# Altium schematic symbol library jlcpcb_2025_04_capacitors_extended_0201.schlib: 1175 symbols (part 1 of 7) (continued)
## 0201CG180J500NT
designator C?  Capacitance: 18pF  (hidden comment: *)
Capacitor, Ceramic (MLCC), 18pF, ±5%, 50V, C0G, ±5%, SMD 0201; Manufacturer: FH (Guangdong Fenghua Advanced Tech); Manufacturer Part Number: 0201CG180J500NT; Package Size: 0201; JLCPCB Basic Part: No; JLCPCB Part Number: C62164; Supplier 1: LCSC; Category: Capacitors - MLCC; Supplier Part Number 1: C62164; Tolerance: ±5%; Voltage Rating: 50V; Temperature Coefficient: C0G; RoHS: Yes; ComponentLink1Description: Datasheet; ComponentLink1URL: https://wmsc.lcsc.com/wmsc/upload/file/pdf/v2/lcsc/2304140030_FH--Guangdong-Fenghua-Advanced-Tech-0201CG180J500NT_C62164.pdf; ComponentLink2Description: JLCPCB Part URL; ComponentLink2URL: https://jlcpcb.com/partdetail/C62164; ComponentLink3Description: LCSC Part URL; ComponentLink3URL: https://lcsc.com/product-detail/Multilayer-Ceramic-Capacitors-MLCC---SMD-SMT_FH-Guangdong-Fenghua-Advanced-Tech-FH-Guangdong-Fenghua-Advanced-Tech-0201CG180J500NT_C62164.html
footprint CAP-0201 (0201 (0603M) Capacitor)
pins: 1, 2

## 0201CG200J500NT
designator C?  Capacitance: 20pF  (hidden comment: *)
Capacitor, Ceramic (MLCC), 20pF, ±5%, 50V, C0G, ±5%, SMD 0201; Manufacturer: FH (Guangdong Fenghua Advanced Tech); Manufacturer Part Number: 0201CG200J500NT; Package Size: 0201; JLCPCB Basic Part: No; JLCPCB Part Number: C71879; Supplier 1: LCSC; Category: Capacitors - MLCC; Supplier Part Number 1: C71879; Tolerance: ±5%; Voltage Rating: 50V; Temperature Coefficient: C0G; RoHS: Yes; ComponentLink1Description: Datasheet; ComponentLink1URL: https://wmsc.lcsc.com/wmsc/upload/file/pdf/v2/lcsc/2304140030_FH--Guangdong-Fenghua-Advanced-Tech-0201CG200J500NT_C71879.pdf; ComponentLink2Description: JLCPCB Part URL; ComponentLink2URL: https://jlcpcb.com/partdetail/C71879; ComponentLink3Description: LCSC Part URL; ComponentLink3URL: https://lcsc.com/product-detail/Multilayer-Ceramic-Capacitors-MLCC---SMD-SMT_FH-Guangdong-Fenghua-Advanced-Tech-FH-Guangdong-Fenghua-Advanced-Tech-0201CG200J500NT_C71879.html
footprint CAP-0201 (0201 (0603M) Capacitor)
pins: 1, 2

## 0201CG220J250NT
designator C?  Capacitance: 22pF  (hidden comment: *)
Capacitor, Ceramic (MLCC), 22pF, ±5%, 25V, C0G, ±5%, SMD 0201; Manufacturer: FH (Guangdong Fenghua Advanced Tech); Manufacturer Part Number: 0201CG220J250NT; Package Size: 0201; JLCPCB Basic Part: No; JLCPCB Part Number: C285194; Supplier 1: LCSC; Category: Capacitors - MLCC; Supplier Part Number 1: C285194; Tolerance: ±5%; Voltage Rating: 25V; Temperature Coefficient: C0G; RoHS: Yes; ComponentLink1Description: Datasheet; ComponentLink2Description: JLCPCB Part URL; ComponentLink2URL: https://jlcpcb.com/partdetail/C285194; ComponentLink3Description: LCSC Part URL; ComponentLink3URL: https://lcsc.com/product-detail/Multilayer-Ceramic-Capacitors-MLCC---SMD-SMT_FH-Guangdong-Fenghua-Advanced-Tech-FH-Guangdong-Fenghua-Advanced-Tech-0201CG220J250NT_C285194.html
footprint CAP-0201 (0201 (0603M) Capacitor)
pins: 1, 2

## 0201CG220J500NT
designator C?  Capacitance: 22pF  (hidden comment: *)
Capacitor, Ceramic (MLCC), 22pF, ±5%, 50V, C0G, ±5%, SMD 0201; Manufacturer: FH (Guangdong Fenghua Advanced Tech); Manufacturer Part Number: 0201CG220J500NT; Package Size: 0201; JLCPCB Basic Part: No; JLCPCB Part Number: C57783; Supplier 1: LCSC; Category: Capacitors - MLCC; Supplier Part Number 1: C57783; Tolerance: ±5%; Voltage Rating: 50V; Temperature Coefficient: C0G; RoHS: Yes; ComponentLink1Description: Datasheet; ComponentLink1URL: https://wmsc.lcsc.com/wmsc/upload/file/pdf/v2/lcsc/2304140030_FH--Guangdong-Fenghua-Advanced-Tech-0201CG220J500NT_C57783.pdf; ComponentLink2Description: JLCPCB Part URL; ComponentLink2URL: https://jlcpcb.com/partdetail/C57783; ComponentLink3Description: LCSC Part URL; ComponentLink3URL: https://lcsc.com/product-detail/Multilayer-Ceramic-Capacitors-MLCC---SMD-SMT_FH-Guangdong-Fenghua-Advanced-Tech-FH-Guangdong-Fenghua-Advanced-Tech-0201CG220J500NT_C57783.html
footprint CAP-0201 (0201 (0603M) Capacitor)
pins: 1, 2

## 0201CG270J500NT
designator C?  Capacitance: 27pF  (hidden comment: *)
Capacitor, Ceramic (MLCC), 27pF, ±5%, 50V, C0G, ±5%, SMD 0201; Manufacturer: FH(Guangdong Fenghua Advanced Tech); Manufacturer Part Number: 0201CG270J500NT; Package Size: 0201; JLCPCB Basic Part: No; JLCPCB Part Number: C62541; Supplier 1: LCSC; Category: Capacitors - MLCC; Supplier Part Number 1: C62541; Tolerance: ±5%; Voltage Rating: 50V; Temperature Coefficient: C0G; RoHS: Yes; ComponentLink1Description: Datasheet; ComponentLink1URL: https://wmsc.lcsc.com/wmsc/upload/file/pdf/v2/lcsc/2304140030_FH--Guangdong-Fenghua-Advanced-Tech-0201CG270J500NT_C62541.pdf; ComponentLink2Description: JLCPCB Part URL; ComponentLink2URL: https://jlcpcb.com/partdetail/C62541; ComponentLink3Description: LCSC Part URL; ComponentLink3URL: https://lcsc.com/product-detail/Multilayer-Ceramic-Capacitors-MLCC---SMD-SMT_FH-Guangdong-Fenghua-Advanced-Tech-FH-Guangdong-Fenghua-Advanced-Tech-0201CG270J500NT_C62541.html
footprint CAP-0201 (0201 (0603M) Capacitor)
pins: 1, 2

## 0201CG300J250NT
designator C?  Capacitance: 30pF  (hidden comment: *)
Capacitor, Ceramic (MLCC), 30pF, ±5%, 25V, ±5%, SMD 0201; Manufacturer: FH (Guangdong Fenghua Advanced Tech); Manufacturer Part Number: 0201CG300J250NT; Package Size: 0201; JLCPCB Basic Part: No; JLCPCB Part Number: C2762281; Supplier 1: LCSC; Category: Capacitors - MLCC; Supplier Part Number 1: C2762281; Tolerance: ±5%; Voltage Rating: 25V; RoHS: Yes; ComponentLink1Description: Datasheet; ComponentLink1URL: https://wmsc.lcsc.com/wmsc/upload/file/pdf/v2/lcsc/2304140030_FH--Guangdong-Fenghua-Advanced-Tech-0201CG300J250NT_C2762281.pdf; ComponentLink2Description: JLCPCB Part URL; ComponentLink2URL: https://jlcpcb.com/partdetail/C2762281; ComponentLink3Description: LCSC Part URL; ComponentLink3URL: https://lcsc.com/product-detail/Multilayer-Ceramic-Capacitors-MLCC---SMD-SMT_FH-Guangdong-Fenghua-Advanced-Tech-FH-Guangdong-Fenghua-Advanced-Tech-0201CG300J250NT_C2762281.html
footprint CAP-0201 (0201 (0603M) Capacitor)
pins: 1, 2

## 0201CG330J250NT
designator C?  Capacitance: 33pF  (hidden comment: *)
Capacitor, Ceramic (MLCC), 33pF, ±5%, 25V, C0G, ±5%, SMD 0201; Manufacturer: FH(Guangdong Fenghua Advanced Tech); Manufacturer Part Number: 0201CG330J250NT; Package Size: 0201; JLCPCB Basic Part: No; JLCPCB Part Number: C285185; Supplier 1: LCSC; Category: Capacitors - MLCC; Supplier Part Number 1: C285185; Tolerance: ±5%; Voltage Rating: 25V; Temperature Coefficient: C0G; RoHS: Yes; ComponentLink1Description: Datasheet; ComponentLink1URL: https://wmsc.lcsc.com/wmsc/upload/file/pdf/v2/lcsc/2304140030_FH--Guangdong-Fenghua-Advanced-Tech-0201CG330J250NT_C285185.pdf; ComponentLink2Description: JLCPCB Part URL; ComponentLink2URL: https://jlcpcb.com/partdetail/C285185; ComponentLink3Description: LCSC Part URL; ComponentLink3URL: https://lcsc.com/product-detail/Multilayer-Ceramic-Capacitors-MLCC---SMD-SMT_FH-Guangdong-Fenghua-Advanced-Tech-FH-Guangdong-Fenghua-Advanced-Tech-0201CG330J250NT_C285185.html
footprint CAP-0201 (0201 (0603M) Capacitor)
pins: 1, 2

## 0201CG330J500NT
designator C?  Capacitance: 33pF  (hidden comment: *)
Capacitor, Ceramic (MLCC), 33pF, ±5%, 50V, C0G, ±5%, SMD 0201; Manufacturer: FH (Guangdong Fenghua Advanced Tech); Manufacturer Part Number: 0201CG330J500NT; Package Size: 0201; JLCPCB Basic Part: No; JLCPCB Part Number: C56903; Supplier 1: LCSC; Category: Capacitors - MLCC; Supplier Part Number 1: C56903; Tolerance: ±5%; Voltage Rating: 50V; Temperature Coefficient: C0G; RoHS: Yes; ComponentLink1Description: Datasheet; ComponentLink1URL: https://wmsc.lcsc.com/wmsc/upload/file/pdf/v2/lcsc/2304140030_FH--Guangdong-Fenghua-Advanced-Tech-0201CG330J500NT_C56903.pdf; ComponentLink2Description: JLCPCB Part URL; ComponentLink2URL: https://jlcpcb.com/partdetail/C56903; ComponentLink3Description: LCSC Part URL; ComponentLink3URL: https://lcsc.com/product-detail/Multilayer-Ceramic-Capacitors-MLCC---SMD-SMT_FH-Guangdong-Fenghua-Advanced-Tech-FH-Guangdong-Fenghua-Advanced-Tech-0201CG330J500NT_C56903.html
footprint CAP-0201 (0201 (0603M) Capacitor)
pins: 1, 2

## 0201CG390J500NT
designator C?  Capacitance: 39pF  (hidden comment: *)
Capacitor, Ceramic (MLCC), 39pF, ±5%, 50V, C0G, ±5%, SMD 0201; Manufacturer: FH (Guangdong Fenghua Advanced Tech); Manufacturer Part Number: 0201CG390J500NT; Package Size: 0201; JLCPCB Basic Part: No; JLCPCB Part Number: C285092; Supplier 1: LCSC; Category: Capacitors - MLCC; Supplier Part Number 1: C285092; Tolerance: ±5%; Voltage Rating: 50V; Temperature Coefficient: C0G; RoHS: Yes; ComponentLink1Description: Datasheet; ComponentLink1URL: https://wmsc.lcsc.com/wmsc/upload/file/pdf/v2/lcsc/2304140030_FH--Guangdong-Fenghua-Advanced-Tech-0201CG390J500NT_C285092.pdf; ComponentLink2Description: JLCPCB Part URL; ComponentLink2URL: https://jlcpcb.com/partdetail/C285092; ComponentLink3Description: LCSC Part URL; ComponentLink3URL: https://lcsc.com/product-detail/Multilayer-Ceramic-Capacitors-MLCC---SMD-SMT_FH-Guangdong-Fenghua-Advanced-Tech-FH-Guangdong-Fenghua-Advanced-Tech-0201CG390J500NT_C285092.html
footprint CAP-0201 (0201 (0603M) Capacitor)
pins: 1, 2

## 0201CG470J500NT
designator C?  Capacitance: 47pF  (hidden comment: *)
Capacitor, Ceramic (MLCC), 47pF, ±5%, 50V, C0G, ±5%, SMD 0201; Manufacturer: FH (Guangdong Fenghua Advanced Tech); Manufacturer Part Number: 0201CG470J500NT; Package Size: 0201; JLCPCB Basic Part: No; JLCPCB Part Number: C62546; Supplier 1: LCSC; Category: Capacitors - MLCC; Supplier Part Number 1: C62546; Tolerance: ±5%; Voltage Rating: 50V; Temperature Coefficient: C0G; RoHS: Yes; ComponentLink1Description: Datasheet; ComponentLink1URL: https://wmsc.lcsc.com/wmsc/upload/file/pdf/v2/lcsc/2304140030_FH--Guangdong-Fenghua-Advanced-Tech-0201CG470J500NT_C62546.pdf; ComponentLink2Description: JLCPCB Part URL; ComponentLink2URL: https://jlcpcb.com/partdetail/C62546; ComponentLink3Description: LCSC Part URL; ComponentLink3URL: https://lcsc.com/product-detail/Multilayer-Ceramic-Capacitors-MLCC---SMD-SMT_FH-Guangdong-Fenghua-Advanced-Tech-FH-Guangdong-Fenghua-Advanced-Tech-0201CG470J500NT_C62546.html
footprint CAP-0201 (0201 (0603M) Capacitor)
pins: 1, 2

## 0201CG680J500NT
designator C?  Capacitance: 68pF  (hidden comment: *)
Capacitor, Ceramic (MLCC), 68pF, ±5%, 50V, C0G, ±5%, SMD 0201; Manufacturer: FH (Guangdong Fenghua Advanced Tech); Manufacturer Part Number: 0201CG680J500NT; Package Size: 0201; JLCPCB Basic Part: No; JLCPCB Part Number: C192309; Supplier 1: LCSC; Category: Capacitors - MLCC; Supplier Part Number 1: C192309; Tolerance: ±5%; Voltage Rating: 50V; Temperature Coefficient: C0G; RoHS: Yes; ComponentLink1Description: Datasheet; ComponentLink1URL: https://wmsc.lcsc.com/wmsc/upload/file/pdf/v2/lcsc/1811061040_FH--Guangdong-Fenghua-Advanced-Tech-0201CG680J500NT_C192309.pdf; ComponentLink2Description: JLCPCB Part URL; ComponentLink2URL: https://jlcpcb.com/partdetail/C192309; ComponentLink3Description: LCSC Part URL; ComponentLink3URL: https://lcsc.com/product-detail/Multilayer-Ceramic-Capacitors-MLCC---SMD-SMT_FH-Guangdong-Fenghua-Advanced-Tech-FH-Guangdong-Fenghua-Advanced-Tech-0201CG680J500NT_C192309.html
footprint CAP-0201 (0201 (0603M) Capacitor)
pins: 1, 2

## 0201CGR75B500NT
designator C?  Capacitance: 0.75pF  (hidden comment: *)
Capacitor, Ceramic (MLCC), 0.75pF, 50V, C0G, SMD 0201; Manufacturer: FH (Guangdong Fenghua Advanced Tech); Manufacturer Part Number: 0201CGR75B500NT; Package Size: 0201; JLCPCB Basic Part: No; JLCPCB Part Number: C284994; Supplier 1: LCSC; Category: Capacitors - MLCC; Supplier Part Number 1: C284994; Voltage Rating: 50V; Temperature Coefficient: C0G; RoHS: Yes; ComponentLink1Description: Datasheet; ComponentLink1URL: https://wmsc.lcsc.com/wmsc/upload/file/pdf/v2/lcsc/2204121100_FH--Guangdong-Fenghua-Advanced-Tech-0201CGR75B500NT_C284994.pdf; ComponentLink2Description: JLCPCB Part URL; ComponentLink2URL: https://jlcpcb.com/partdetail/C284994; ComponentLink3Description: LCSC Part URL; ComponentLink3URL: https://lcsc.com/product-detail/Multilayer-Ceramic-Capacitors-MLCC---SMD-SMT_FH-Guangdong-Fenghua-Advanced-Tech-FH-Guangdong-Fenghua-Advanced-Tech-0201CGR75B500NT_C284994.html
footprint CAP-0201 (0201 (0603M) Capacitor)
pins: 1, 2

## 0201HQ1R2B250NT
designator C?  Capacitance: 1.2pF  (hidden comment: *)
Capacitor, Ceramic (MLCC), 1.2pF, 25V, C0G, SMD 0201; Manufacturer: FH(Guangdong Fenghua Advanced Tech); Manufacturer Part Number: 0201HQ1R2B250NT; Package Size: 0201; JLCPCB Basic Part: No; JLCPCB Part Number: C284970; Supplier 1: LCSC; Category: Capacitors - MLCC; Supplier Part Number 1: C284970; Voltage Rating: 25V; Temperature Coefficient: C0G; RoHS: Yes; ComponentLink1Description: Datasheet; ComponentLink1URL: https://wmsc.lcsc.com/wmsc/upload/file/pdf/v2/lcsc/2304140030_FH--Guangdong-Fenghua-Advanced-Tech-0201HQ1R2B250NT_C284970.pdf; ComponentLink2Description: JLCPCB Part URL; ComponentLink2URL: https://jlcpcb.com/partdetail/C284970; ComponentLink3Description: LCSC Part URL; ComponentLink3URL: https://lcsc.com/product-detail/Multilayer-Ceramic-Capacitors-MLCC---SMD-SMT_FH-Guangdong-Fenghua-Advanced-Tech-FH-Guangdong-Fenghua-Advanced-Tech-0201HQ1R2B250NT_C284970.html
footprint CAP-0201 (0201 (0603M) Capacitor)
pins: 1, 2

## 0201HQ1R5B250NT
designator C?  Capacitance: 1.5pF  (hidden comment: *)
Capacitor, Ceramic (MLCC), 1.5pF, 25V, C0G, SMD 0201; Manufacturer: FH(Guangdong Fenghua Advanced Tech); Manufacturer Part Number: 0201HQ1R5B250NT; Package Size: 0201; JLCPCB Basic Part: No; JLCPCB Part Number: C284980; Supplier 1: LCSC; Category: Capacitors - MLCC; Supplier Part Number 1: C284980; Voltage Rating: 25V; Temperature Coefficient: C0G; RoHS: Yes; ComponentLink1Description: Datasheet; ComponentLink1URL: https://wmsc.lcsc.com/wmsc/upload/file/pdf/v2/lcsc/2304140030_FH--Guangdong-Fenghua-Advanced-Tech-0201HQ1R5B250NT_C284980.pdf; ComponentLink2Description: JLCPCB Part URL; ComponentLink2URL: https://jlcpcb.com/partdetail/C284980; ComponentLink3Description: LCSC Part URL; ComponentLink3URL: https://lcsc.com/product-detail/Multilayer-Ceramic-Capacitors-MLCC---SMD-SMT_FH-Guangdong-Fenghua-Advanced-Tech-FH-Guangdong-Fenghua-Advanced-Tech-0201HQ1R5B250NT_C284980.html
footprint CAP-0201 (0201 (0603M) Capacitor)
pins: 1, 2

## 0201HQ2R7B250NT
designator C?  Capacitance: 2.7pF  (hidden comment: *)
Capacitor, Ceramic (MLCC), 2.7pF, 25V, C0G, SMD 0201; Manufacturer: FH(Guangdong Fenghua Advanced Tech); Manufacturer Part Number: 0201HQ2R7B250NT; Package Size: 0201; JLCPCB Basic Part: No; JLCPCB Part Number: C284998; Supplier 1: LCSC; Category: Capacitors - MLCC; Supplier Part Number 1: C284998; Voltage Rating: 25V; Temperature Coefficient: C0G; RoHS: Yes; ComponentLink1Description: Datasheet; ComponentLink1URL: https://wmsc.lcsc.com/wmsc/upload/file/pdf/v2/lcsc/2304140030_FH--Guangdong-Fenghua-Advanced-Tech-0201HQ2R7B250NT_C284998.pdf; ComponentLink2Description: JLCPCB Part URL; ComponentLink2URL: https://jlcpcb.com/partdetail/C284998; ComponentLink3Description: LCSC Part URL; ComponentLink3URL: https://lcsc.com/product-detail/Multilayer-Ceramic-Capacitors-MLCC---SMD-SMT_FH-Guangdong-Fenghua-Advanced-Tech-FH-Guangdong-Fenghua-Advanced-Tech-0201HQ2R7B250NT_C284998.html
footprint CAP-0201 (0201 (0603M) Capacitor)
pins: 1, 2

## 0201N0R2B250CT
designator C?  Capacitance: 0.2pF  (hidden comment: *)
Capacitor, Ceramic (MLCC), 0.2pF, 25V, NP0, SMD 0201; Manufacturer: Walsin Tech Corp; Manufacturer Part Number: 0201N0R2B250CT; Package Size: 0201; JLCPCB Basic Part: No; JLCPCB Part Number: C880830; Supplier 1: LCSC; Category: Capacitors - MLCC; Supplier Part Number 1: C880830; Voltage Rating: 25V; Temperature Coefficient: NP0; RoHS: Yes; ComponentLink1Description: Datasheet; ComponentLink1URL: https://wmsc.lcsc.com/wmsc/upload/file/pdf/v2/lcsc/2304140030_Walsin-Tech-Corp-0201N0R2B250CT_C880830.pdf; ComponentLink2Description: JLCPCB Part URL; ComponentLink2URL: https://jlcpcb.com/partdetail/C880830; ComponentLink3Description: LCSC Part URL; ComponentLink3URL: https://lcsc.com/product-detail/Multilayer-Ceramic-Capacitors-MLCC---SMD-SMT_Walsin-Tech-Corp-Walsin-Tech-Corp-0201N0R2B250CT_C880830.html
footprint CAP-0201 (0201 (0603M) Capacitor)
pins: 1, 2

## 0201N0R5C250CT
designator C?  Capacitance: 0.5pF  (hidden comment: *)
Capacitor, Ceramic (MLCC), 0.5pF, 25V, NP0, SMD 0201; Manufacturer: Walsin Tech Corp; Manufacturer Part Number: 0201N0R5C250CT; Package Size: 0201; JLCPCB Basic Part: No; JLCPCB Part Number: C525487; Supplier 1: LCSC; Category: Capacitors - MLCC; Supplier Part Number 1: C525487; Voltage Rating: 25V; Temperature Coefficient: NP0; RoHS: Yes; ComponentLink1Description: Datasheet; ComponentLink1URL: https://wmsc.lcsc.com/wmsc/upload/file/pdf/v2/lcsc/2304140030_Walsin-Tech-Corp-0201N0R5C250CT_C525487.pdf; ComponentLink2Description: JLCPCB Part URL; ComponentLink2URL: https://jlcpcb.com/partdetail/C525487; ComponentLink3Description: LCSC Part URL; ComponentLink3URL: https://lcsc.com/product-detail/Multilayer-Ceramic-Capacitors-MLCC---SMD-SMT_Walsin-Tech-Corp-Walsin-Tech-Corp-0201N0R5C250CT_C525487.html
footprint CAP-0201 (0201 (0603M) Capacitor)
pins: 1, 2

## 0201N0R8C500CT
designator C?  Capacitance: 0.8pF  (hidden comment: *)
Capacitor, Ceramic (MLCC), 0.8pF, 50V, NP0, SMD 0201; Manufacturer: Walsin Tech Corp; Manufacturer Part Number: 0201N0R8C500CT; Package Size: 0201; JLCPCB Basic Part: No; JLCPCB Part Number: C880883; Supplier 1: LCSC; Category: Capacitors - MLCC; Supplier Part Number 1: C880883; Voltage Rating: 50V; Temperature Coefficient: NP0; RoHS: Yes; ComponentLink1Description: Datasheet; ComponentLink1URL: https://wmsc.lcsc.com/wmsc/upload/file/pdf/v2/lcsc/2304140030_Walsin-Tech-Corp-0201N0R8C500CT_C880883.pdf; ComponentLink2Description: JLCPCB Part URL; ComponentLink2URL: https://jlcpcb.com/partdetail/C880883; ComponentLink3Description: LCSC Part URL; ComponentLink3URL: https://lcsc.com/product-detail/Multilayer-Ceramic-Capacitors-MLCC---SMD-SMT_Walsin-Tech-Corp-Walsin-Tech-Corp-0201N0R8C500CT_C880883.html
footprint CAP-0201 (0201 (0603M) Capacitor)
pins: 1, 2

## 0201N1R0C500LT
designator C?  Capacitance: 1pF  (hidden comment: *)
Capacitor, Ceramic (MLCC), 1pF, 50V, NP0, SMD 0201; Manufacturer: Walsin Tech Corp; Manufacturer Part Number: 0201N1R0C500LT; Package Size: 0201; JLCPCB Basic Part: No; JLCPCB Part Number: C364218; Supplier 1: LCSC; Category: Capacitors - MLCC; Supplier Part Number 1: C364218; Voltage Rating: 50V; Temperature Coefficient: NP0; RoHS: Yes; ComponentLink1Description: Datasheet; ComponentLink1URL: https://wmsc.lcsc.com/wmsc/upload/file/pdf/v2/lcsc/2304140030_Walsin-Tech-Corp-0201N1R0C500LT_C364218.pdf; ComponentLink2Description: JLCPCB Part URL; ComponentLink2URL: https://jlcpcb.com/partdetail/C364218; ComponentLink3Description: LCSC Part URL; ComponentLink3URL: https://lcsc.com/product-detail/Multilayer-Ceramic-Capacitors-MLCC---SMD-SMT_Walsin-Tech-Corp-Walsin-Tech-Corp-0201N1R0C500LT_C364218.html
footprint CAP-0201 (0201 (0603M) Capacitor)
pins: 1, 2

## 0201N1R2A500CT
designator C?  Capacitance: 1.2pF  (hidden comment: *)
Capacitor, Ceramic (MLCC), 1.2pF, 50V, NP0, SMD 0201; Manufacturer: Walsin Tech Corp; Manufacturer Part Number: 0201N1R2A500CT; Package Size: 0201; JLCPCB Basic Part: No; JLCPCB Part Number: C880792; Supplier 1: LCSC; Category: Capacitors - MLCC; Supplier Part Number 1: C880792; Voltage Rating: 50V; Temperature Coefficient: NP0; RoHS: Yes; ComponentLink1Description: Datasheet; ComponentLink1URL: https://wmsc.lcsc.com/wmsc/upload/file/pdf/v2/lcsc/2304140030_Walsin-Tech-Corp-0201N1R2A500CT_C880792.pdf; ComponentLink2Description: JLCPCB Part URL; ComponentLink2URL: https://jlcpcb.com/partdetail/C880792; ComponentLink3Description: LCSC Part URL; ComponentLink3URL: https://lcsc.com/product-detail/Multilayer-Ceramic-Capacitors-MLCC---SMD-SMT_Walsin-Tech-Corp-Walsin-Tech-Corp-0201N1R2A500CT_C880792.html
footprint CAP-0201 (0201 (0603M) Capacitor)
pins: 1, 2

## 0201N1R2B500CT
designator C?  Capacitance: 1.2pF  (hidden comment: *)
Capacitor, Ceramic (MLCC), 1.2pF, 50V, NP0, SMD 0201; Manufacturer: Walsin Tech Corp; Manufacturer Part Number: 0201N1R2B500CT; Package Size: 0201; JLCPCB Basic Part: No; JLCPCB Part Number: C880803; Supplier 1: LCSC; Category: Capacitors - MLCC; Supplier Part Number 1: C880803; Voltage Rating: 50V; Temperature Coefficient: NP0; RoHS: Yes; ComponentLink1Description: Datasheet; ComponentLink1URL: https://wmsc.lcsc.com/wmsc/upload/file/pdf/v2/lcsc/2304140030_Walsin-Tech-Corp-0201N1R2B500CT_C880803.pdf; ComponentLink2Description: JLCPCB Part URL; ComponentLink2URL: https://jlcpcb.com/partdetail/C880803; ComponentLink3Description: LCSC Part URL; ComponentLink3URL: https://lcsc.com/product-detail/Multilayer-Ceramic-Capacitors-MLCC---SMD-SMT_Walsin-Tech-Corp-Walsin-Tech-Corp-0201N1R2B500CT_C880803.html
footprint CAP-0201 (0201 (0603M) Capacitor)
pins: 1, 2

## 0201N1R5C250CT
designator C?  Capacitance: 1.5pF  (hidden comment: *)
Capacitor, Ceramic (MLCC), 1.5pF, 25V, NP0, SMD 0201; Manufacturer: Walsin Tech Corp; Manufacturer Part Number: 0201N1R5C250CT; Package Size: 0201; JLCPCB Basic Part: No; JLCPCB Part Number: C424820; Supplier 1: LCSC; Category: Capacitors - MLCC; Supplier Part Number 1: C424820; Voltage Rating: 25V; Temperature Coefficient: NP0; RoHS: Yes; ComponentLink1Description: Datasheet; ComponentLink1URL: https://wmsc.lcsc.com/wmsc/upload/file/pdf/v2/lcsc/2304140030_Walsin-Tech-Corp-0201N1R5C250CT_C424820.pdf; ComponentLink2Description: JLCPCB Part URL; ComponentLink2URL: https://jlcpcb.com/partdetail/C424820; ComponentLink3Description: LCSC Part URL; ComponentLink3URL: https://lcsc.com/product-detail/Multilayer-Ceramic-Capacitors-MLCC---SMD-SMT_Walsin-Tech-Corp-Walsin-Tech-Corp-0201N1R5C250CT_C424820.html
footprint CAP-0201 (0201 (0603M) Capacitor)
pins: 1, 2

## 0201N1R6C500CT
designator C?  Capacitance: 1.6pF  (hidden comment: *)
Capacitor, Ceramic (MLCC), 1.6pF, 50V, NP0, SMD 0201; Manufacturer: Walsin Tech Corp; Manufacturer Part Number: 0201N1R6C500CT; Package Size: 0201; JLCPCB Basic Part: No; JLCPCB Part Number: C555390; Supplier 1: LCSC; Category: Capacitors - MLCC; Supplier Part Number 1: C555390; Voltage Rating: 50V; Temperature Coefficient: NP0; RoHS: Yes; ComponentLink1Description: Datasheet; ComponentLink1URL: https://wmsc.lcsc.com/wmsc/upload/file/pdf/v2/lcsc/2304140030_Walsin-Tech-Corp-0201N1R6C500CT_C555390.pdf; ComponentLink2Description: JLCPCB Part URL; ComponentLink2URL: https://jlcpcb.com/partdetail/C555390; ComponentLink3Description: LCSC Part URL; ComponentLink3URL: https://lcsc.com/product-detail/Multilayer-Ceramic-Capacitors-MLCC---SMD-SMT_Walsin-Tech-Corp-Walsin-Tech-Corp-0201N1R6C500CT_C555390.html
footprint CAP-0201 (0201 (0603M) Capacitor)
pins: 1, 2

## 0201N2R0C500CT
designator C?  Capacitance: 2pF  (hidden comment: *)
Capacitor, Ceramic (MLCC), 2pF, 50V, NP0, SMD 0201; Manufacturer: Walsin Tech Corp; Manufacturer Part Number: 0201N2R0C500CT; Package Size: 0201; JLCPCB Basic Part: No; JLCPCB Part Number: C295910; Supplier 1: LCSC; Category: Capacitors - MLCC; Supplier Part Number 1: C295910; Voltage Rating: 50V; Temperature Coefficient: NP0; RoHS: Yes; ComponentLink1Description: Datasheet; ComponentLink1URL: https://wmsc.lcsc.com/wmsc/upload/file/pdf/v2/lcsc/2304140030_Walsin-Tech-Corp-0201N2R0C500CT_C295910.pdf; ComponentLink2Description: JLCPCB Part URL; ComponentLink2URL: https://jlcpcb.com/partdetail/C295910; ComponentLink3Description: LCSC Part URL; ComponentLink3URL: https://lcsc.com/product-detail/Multilayer-Ceramic-Capacitors-MLCC---SMD-SMT_Walsin-Tech-Corp-Walsin-Tech-Corp-0201N2R0C500CT_C295910.html
footprint CAP-0201 (0201 (0603M) Capacitor)
pins: 1, 2

## 0201N2R2B250CT
designator C?  Capacitance: 2.2pF  (hidden comment: *)
Capacitor, Ceramic (MLCC), 2.2pF, 25V, NP0, SMD 0201; Manufacturer: Walsin Tech Corp; Manufacturer Part Number: 0201N2R2B250CT; Package Size: 0201; JLCPCB Basic Part: No; JLCPCB Part Number: C2840189; Supplier 1: LCSC; Category: Capacitors - MLCC; Supplier Part Number 1: C2840189; Voltage Rating: 25V; Temperature Coefficient: NP0; RoHS: Yes; ComponentLink1Description: Datasheet; ComponentLink1URL: https://wmsc.lcsc.com/wmsc/upload/file/pdf/v2/lcsc/2202132000_Walsin-Tech-Corp-0201N2R2B250CT_C2840189.pdf; ComponentLink2Description: JLCPCB Part URL; ComponentLink2URL: https://jlcpcb.com/partdetail/C2840189; ComponentLink3Description: LCSC Part URL; ComponentLink3URL: https://lcsc.com/product-detail/Multilayer-Ceramic-Capacitors-MLCC---SMD-SMT_Walsin-Tech-Corp-Walsin-Tech-Corp-0201N2R2B250CT_C2840189.html
footprint CAP-0201 (0201 (0603M) Capacitor)
pins: 1, 2

## 0201N2R2B500CT
designator C?  Capacitance: 2.2pF  (hidden comment: *)
Capacitor, Ceramic (MLCC), 2.2pF, 50V, NP0, SMD 0201; Manufacturer: Walsin Tech Corp; Manufacturer Part Number: 0201N2R2B500CT; Package Size: 0201; JLCPCB Basic Part: No; JLCPCB Part Number: C880846; Supplier 1: LCSC; Category: Capacitors - MLCC; Supplier Part Number 1: C880846; Voltage Rating: 50V; Temperature Coefficient: NP0; RoHS: Yes; ComponentLink1Description: Datasheet; ComponentLink1URL: https://wmsc.lcsc.com/wmsc/upload/file/pdf/v2/lcsc/2304140030_Walsin-Tech-Corp-0201N2R2B500CT_C880846.pdf; ComponentLink2Description: JLCPCB Part URL; ComponentLink2URL: https://jlcpcb.com/partdetail/C880846; ComponentLink3Description: LCSC Part URL; ComponentLink3URL: https://lcsc.com/product-detail/Multilayer-Ceramic-Capacitors-MLCC---SMD-SMT_Walsin-Tech-Corp-Walsin-Tech-Corp-0201N2R2B500CT_C880846.html
footprint CAP-0201 (0201 (0603M) Capacitor)
pins: 1, 2

## 0201N2R2C500
designator C?  Capacitance: 2.2pF  (hidden comment: *)
Capacitor, Ceramic (MLCC), 2.2pF, 50V, NP0, SMD 0201; Manufacturer: Walsin Tech Corp; Manufacturer Part Number: 0201N2R2C500; Package Size: 0201; JLCPCB Basic Part: No; JLCPCB Part Number: C152770; Supplier 1: LCSC; Category: Capacitors - MLCC; Supplier Part Number 1: C152770; Voltage Rating: 50V; Temperature Coefficient: NP0; RoHS: Yes; ComponentLink1Description: Datasheet; ComponentLink1URL: https://wmsc.lcsc.com/wmsc/upload/file/pdf/v2/lcsc/2304140030_Walsin-Tech-Corp-0201N2R2C500_C152770.pdf; ComponentLink2Description: JLCPCB Part URL; ComponentLink2URL: https://jlcpcb.com/partdetail/C152770; ComponentLink3Description: LCSC Part URL; ComponentLink3URL: https://lcsc.com/product-detail/Multilayer-Ceramic-Capacitors-MLCC---SMD-SMT_Walsin-Tech-Corp-Walsin-Tech-Corp-0201N2R2C500_C152770.html
footprint CAP-0201 (0201 (0603M) Capacitor)
pins: 1, 2

## 0201N3R0C250CT
designator C?  Capacitance: 3pF  (hidden comment: *)
Capacitor, Ceramic (MLCC), 3pF, 25V, NP0, SMD 0201; Manufacturer: Walsin Tech Corp; Manufacturer Part Number: 0201N3R0C250CT; Package Size: 0201; JLCPCB Basic Part: No; JLCPCB Part Number: C2918053; Supplier 1: LCSC; Category: Capacitors - MLCC; Supplier Part Number 1: C2918053; Voltage Rating: 25V; Temperature Coefficient: NP0; RoHS: Yes; ComponentLink1Description: Datasheet; ComponentLink1URL: https://wmsc.lcsc.com/wmsc/upload/file/pdf/v2/lcsc/2111181830_Walsin-Tech-Corp-0201N3R0C250CT_C2918053.pdf; ComponentLink2Description: JLCPCB Part URL; ComponentLink2URL: https://jlcpcb.com/partdetail/C2918053; ComponentLink3Description: LCSC Part URL; ComponentLink3URL: https://lcsc.com/product-detail/Multilayer-Ceramic-Capacitors-MLCC---SMD-SMT_Walsin-Tech-Corp-Walsin-Tech-Corp-0201N3R0C250CT_C2918053.html
footprint CAP-0201 (0201 (0603M) Capacitor)
pins: 1, 2

## 0201N3R0C500CT
designator C?  Capacitance: 3pF  (hidden comment: *)
Capacitor, Ceramic (MLCC), 3pF, 50V, NP0, SMD 0201; Manufacturer: Walsin Tech Corp; Manufacturer Part Number: 0201N3R0C500CT; Package Size: 0201; JLCPCB Basic Part: No; JLCPCB Part Number: C295912; Supplier 1: LCSC; Category: Capacitors - MLCC; Supplier Part Number 1: C295912; Voltage Rating: 50V; Temperature Coefficient: NP0; RoHS: Yes; ComponentLink1Description: Datasheet; ComponentLink1URL: https://wmsc.lcsc.com/wmsc/upload/file/pdf/v2/lcsc/2304140030_Walsin-Tech-Corp-0201N3R0C500CT_C295912.pdf; ComponentLink2Description: JLCPCB Part URL; ComponentLink2URL: https://jlcpcb.com/partdetail/C295912; ComponentLink3Description: LCSC Part URL; ComponentLink3URL: https://lcsc.com/product-detail/Multilayer-Ceramic-Capacitors-MLCC---SMD-SMT_Walsin-Tech-Corp-Walsin-Tech-Corp-0201N3R0C500CT_C295912.html
footprint CAP-0201 (0201 (0603M) Capacitor)
pins: 1, 2

## 0201N3R3C250CT
designator C?  Capacitance: 3.3pF  (hidden comment: *)
Capacitor, Ceramic (MLCC), 3.3pF, 25V, NP0, SMD 0201; Manufacturer: Walsin Tech Corp; Manufacturer Part Number: 0201N3R3C250CT; Package Size: 0201; JLCPCB Basic Part: No; JLCPCB Part Number: C559306; Supplier 1: LCSC; Category: Capacitors - MLCC; Supplier Part Number 1: C559306; Voltage Rating: 25V; Temperature Coefficient: NP0; RoHS: Yes; ComponentLink1Description: Datasheet; ComponentLink1URL: https://wmsc.lcsc.com/wmsc/upload/file/pdf/v2/lcsc/2304140030_Walsin-Tech-Corp-0201N3R3C250CT_C559306.pdf; ComponentLink2Description: JLCPCB Part URL; ComponentLink2URL: https://jlcpcb.com/partdetail/C559306; ComponentLink3Description: LCSC Part URL; ComponentLink3URL: https://lcsc.com/product-detail/Multilayer-Ceramic-Capacitors-MLCC---SMD-SMT_Walsin-Tech-Corp-Walsin-Tech-Corp-0201N3R3C250CT_C559306.html
footprint CAP-0201 (0201 (0603M) Capacitor)
pins: 1, 2

## 0201N4R0B500CT
designator C?  Capacitance: 4pF  (hidden comment: *)
Capacitor, Ceramic (MLCC), 4pF, 50V, NP0, SMD 0201; Manufacturer: Walsin Tech Corp; Manufacturer Part Number: 0201N4R0B500CT; Package Size: 0201; JLCPCB Basic Part: No; JLCPCB Part Number: C2962045; Supplier 1: LCSC; Category: Capacitors - MLCC; Supplier Part Number 1: C2962045; Voltage Rating: 50V; Temperature Coefficient: NP0; RoHS: Yes; ComponentLink1Description: Datasheet; ComponentLink1URL: https://wmsc.lcsc.com/wmsc/upload/file/pdf/v2/lcsc/2201181800_Walsin-Tech-Corp-0201N4R0B500CT_C2962045.pdf; ComponentLink2Description: JLCPCB Part URL; ComponentLink2URL: https://jlcpcb.com/partdetail/C2962045; ComponentLink3Description: LCSC Part URL; ComponentLink3URL: https://lcsc.com/product-detail/Multilayer-Ceramic-Capacitors-MLCC---SMD-SMT_Walsin-Tech-Corp-Walsin-Tech-Corp-0201N4R0B500CT_C2962045.html
footprint CAP-0201 (0201 (0603M) Capacitor)
pins: 1, 2

## 0201N5R0C500CT
designator C?  Capacitance: 5pF  (hidden comment: *)
Capacitor, Ceramic (MLCC), 5pF, 50V, NP0, SMD 0201; Manufacturer: Walsin Tech Corp; Manufacturer Part Number: 0201N5R0C500CT; Package Size: 0201; JLCPCB Basic Part: No; JLCPCB Part Number: C2886122; Supplier 1: LCSC; Category: Capacitors - MLCC; Supplier Part Number 1: C2886122; Voltage Rating: 50V; Temperature Coefficient: NP0; RoHS: Yes; ComponentLink1Description: Datasheet; ComponentLink1URL: https://wmsc.lcsc.com/wmsc/upload/file/pdf/v2/lcsc/2108170930_Walsin-Tech-Corp-0201N5R0C500CT_C2886122.pdf; ComponentLink2Description: JLCPCB Part URL; ComponentLink2URL: https://jlcpcb.com/partdetail/C2886122; ComponentLink3Description: LCSC Part URL; ComponentLink3URL: https://lcsc.com/product-detail/Multilayer-Ceramic-Capacitors-MLCC---SMD-SMT_Walsin-Tech-Corp-Walsin-Tech-Corp-0201N5R0C500CT_C2886122.html
footprint CAP-0201 (0201 (0603M) Capacitor)
pins: 1, 2

## 0201N5R6C500CT
designator C?  Capacitance: 5.6pF  (hidden comment: *)
Capacitor, Ceramic (MLCC), 5.6pF, 50V, NP0, SMD 0201; Manufacturer: Walsin Tech Corp; Manufacturer Part Number: 0201N5R6C500CT; Package Size: 0201; JLCPCB Basic Part: No; JLCPCB Part Number: C880786; Supplier 1: LCSC; Category: Capacitors - MLCC; Supplier Part Number 1: C880786; Voltage Rating: 50V; Temperature Coefficient: NP0; RoHS: Yes; ComponentLink1Description: Datasheet; ComponentLink1URL: https://wmsc.lcsc.com/wmsc/upload/file/pdf/v2/lcsc/2304140030_Walsin-Tech-Corp-0201N5R6C500CT_C880786.pdf; ComponentLink2Description: JLCPCB Part URL; ComponentLink2URL: https://jlcpcb.com/partdetail/C880786; ComponentLink3Description: LCSC Part URL; ComponentLink3URL: https://lcsc.com/product-detail/Multilayer-Ceramic-Capacitors-MLCC---SMD-SMT_Walsin-Tech-Corp-Walsin-Tech-Corp-0201N5R6C500CT_C880786.html
footprint CAP-0201 (0201 (0603M) Capacitor)
pins: 1, 2

## 0201N5R6C500LT
designator C?  Capacitance: 5.6pF  (hidden comment: *)
Capacitor, Ceramic (MLCC), 5.6pF, 50V, NP0, SMD 0201; Manufacturer: Walsin Tech Corp; Manufacturer Part Number: 0201N5R6C500LT; Package Size: 0201; JLCPCB Basic Part: No; JLCPCB Part Number: C364237; Supplier 1: LCSC; Category: Capacitors - MLCC; Supplier Part Number 1: C364237; Voltage Rating: 50V; Temperature Coefficient: NP0; RoHS: Yes; ComponentLink1Description: Datasheet; ComponentLink1URL: https://wmsc.lcsc.com/wmsc/upload/file/pdf/v2/lcsc/2304140030_Walsin-Tech-Corp-0201N5R6C500LT_C364237.pdf; ComponentLink2Description: JLCPCB Part URL; ComponentLink2URL: https://jlcpcb.com/partdetail/C364237; ComponentLink3Description: LCSC Part URL; ComponentLink3URL: https://lcsc.com/product-detail/Multilayer-Ceramic-Capacitors-MLCC---SMD-SMT_Walsin-Tech-Corp-Walsin-Tech-Corp-0201N5R6C500LT_C364237.html
footprint CAP-0201 (0201 (0603M) Capacitor)
pins: 1, 2

## 0201N6R8B500CT
designator C?  Capacitance: 6.8pF  (hidden comment: *)
Capacitor, Ceramic (MLCC), 6.8pF, 50V, NP0, SMD 0201; Manufacturer: Walsin Tech Corp; Manufacturer Part Number: 0201N6R8B500CT; Package Size: 0201; JLCPCB Basic Part: No; JLCPCB Part Number: C555393; Supplier 1: LCSC; Category: Capacitors - MLCC; Supplier Part Number 1: C555393; Voltage Rating: 50V; Temperature Coefficient: NP0; RoHS: Yes; ComponentLink1Description: Datasheet; ComponentLink1URL: https://wmsc.lcsc.com/wmsc/upload/file/pdf/v2/lcsc/2304140030_Walsin-Tech-Corp-0201N6R8B500CT_C555393.pdf; ComponentLink2Description: JLCPCB Part URL; ComponentLink2URL: https://jlcpcb.com/partdetail/C555393; ComponentLink3Description: LCSC Part URL; ComponentLink3URL: https://lcsc.com/product-detail/Multilayer-Ceramic-Capacitors-MLCC---SMD-SMT_Walsin-Tech-Corp-Walsin-Tech-Corp-0201N6R8B500CT_C555393.html
footprint CAP-0201 (0201 (0603M) Capacitor)
pins: 1, 2

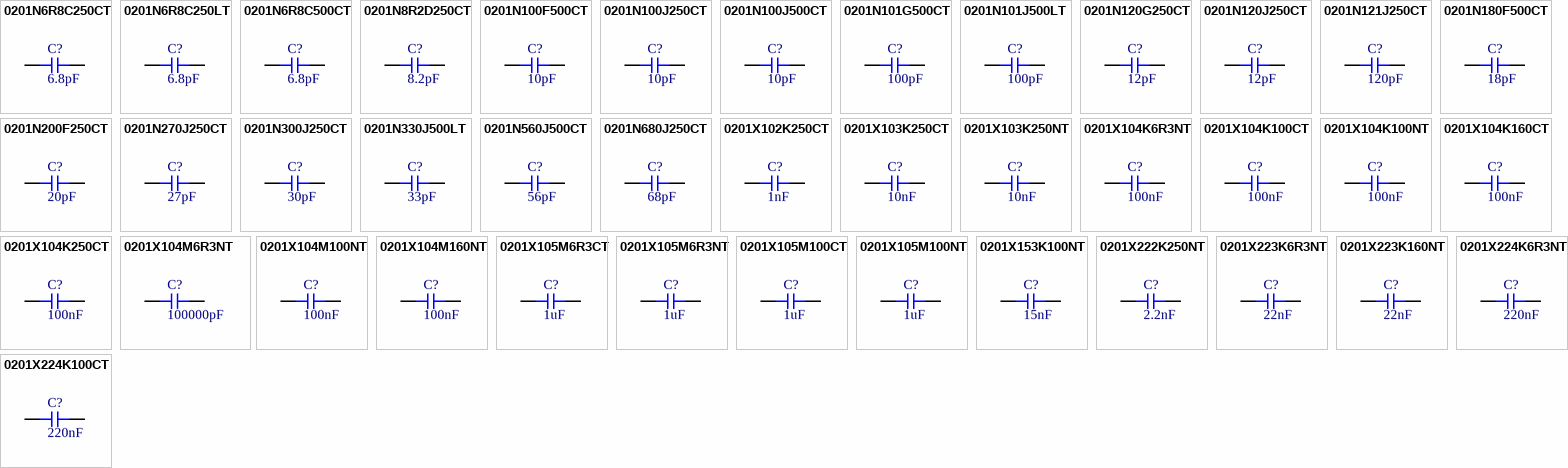
[diagram p3: symbols 0201N6R8C250CT to 0201X224K100CT]

## 0201N6R8C250CT
designator C?  Capacitance: 6.8pF  (hidden comment: *)
Capacitor, Ceramic (MLCC), 6.8pF, 25V, NP0, SMD 0201; Manufacturer: Walsin Tech Corp; Manufacturer Part Number: 0201N6R8C250CT; Package Size: 0201; JLCPCB Basic Part: No; JLCPCB Part Number: C525492; Supplier 1: LCSC; Category: Capacitors - MLCC; Supplier Part Number 1: C525492; Voltage Rating: 25V; Temperature Coefficient: NP0; RoHS: Yes; ComponentLink1Description: Datasheet; ComponentLink1URL: https://wmsc.lcsc.com/wmsc/upload/file/pdf/v2/lcsc/2304140030_Walsin-Tech-Corp-0201N6R8C250CT_C525492.pdf; ComponentLink2Description: JLCPCB Part URL; ComponentLink2URL: https://jlcpcb.com/partdetail/C525492; ComponentLink3Description: LCSC Part URL; ComponentLink3URL: https://lcsc.com/product-detail/Multilayer-Ceramic-Capacitors-MLCC---SMD-SMT_Walsin-Tech-Corp-Walsin-Tech-Corp-0201N6R8C250CT_C525492.html
footprint CAP-0201 (0201 (0603M) Capacitor)
pins: 1, 2

## 0201N6R8C250LT
designator C?  Capacitance: 6.8pF  (hidden comment: *)
Capacitor, Ceramic (MLCC), 6.8pF, 25V, NP0, SMD 0201; Manufacturer: Walsin Tech Corp; Manufacturer Part Number: 0201N6R8C250LT; Package Size: 0201; JLCPCB Basic Part: No; JLCPCB Part Number: C364240; Supplier 1: LCSC; Category: Capacitors - MLCC; Supplier Part Number 1: C364240; Voltage Rating: 25V; Temperature Coefficient: NP0; RoHS: Yes; ComponentLink1Description: Datasheet; ComponentLink1URL: https://wmsc.lcsc.com/wmsc/upload/file/pdf/v2/lcsc/2304140030_Walsin-Tech-Corp-0201N6R8C250LT_C364240.pdf; ComponentLink2Description: JLCPCB Part URL; ComponentLink2URL: https://jlcpcb.com/partdetail/C364240; ComponentLink3Description: LCSC Part URL; ComponentLink3URL: https://lcsc.com/product-detail/Multilayer-Ceramic-Capacitors-MLCC---SMD-SMT_Walsin-Tech-Corp-Walsin-Tech-Corp-0201N6R8C250LT_C364240.html
footprint CAP-0201 (0201 (0603M) Capacitor)
pins: 1, 2

## 0201N6R8C500CT
designator C?  Capacitance: 6.8pF  (hidden comment: *)
Capacitor, Ceramic (MLCC), 6.8pF, 50V, NP0, SMD 0201; Manufacturer: Walsin Tech Corp; Manufacturer Part Number: 0201N6R8C500CT; Package Size: 0201; JLCPCB Basic Part: No; JLCPCB Part Number: C2992627; Supplier 1: LCSC; Category: Capacitors - MLCC; Supplier Part Number 1: C2992627; Voltage Rating: 50V; Temperature Coefficient: NP0; RoHS: Yes; ComponentLink1Description: Datasheet; ComponentLink1URL: https://wmsc.lcsc.com/wmsc/upload/file/pdf/v2/lcsc/2204121445_Walsin-Tech-Corp-0201N6R8C500CT_C2992627.pdf; ComponentLink2Description: JLCPCB Part URL; ComponentLink2URL: https://jlcpcb.com/partdetail/C2992627; ComponentLink3Description: LCSC Part URL; ComponentLink3URL: https://lcsc.com/product-detail/Multilayer-Ceramic-Capacitors-MLCC---SMD-SMT_Walsin-Tech-Corp-Walsin-Tech-Corp-0201N6R8C500CT_C2992627.html
footprint CAP-0201 (0201 (0603M) Capacitor)
pins: 1, 2

## 0201N8R2D250CT
designator C?  Capacitance: 8.2pF  (hidden comment: *)
Capacitor, Ceramic (MLCC), 8.2pF, 25V, NP0, SMD 0201; Manufacturer: Walsin Tech Corp; Manufacturer Part Number: 0201N8R2D250CT; Package Size: 0201; JLCPCB Basic Part: No; JLCPCB Part Number: C2894183; Supplier 1: LCSC; Category: Capacitors - MLCC; Supplier Part Number 1: C2894183; Voltage Rating: 25V; Temperature Coefficient: NP0; RoHS: Yes; ComponentLink1Description: Datasheet; ComponentLink1URL: https://wmsc.lcsc.com/wmsc/upload/file/pdf/v2/lcsc/2109071830_Walsin-Tech-Corp-0201N8R2D250CT_C2894183.pdf; ComponentLink2Description: JLCPCB Part URL; ComponentLink2URL: https://jlcpcb.com/partdetail/C2894183; ComponentLink3Description: LCSC Part URL; ComponentLink3URL: https://lcsc.com/product-detail/Multilayer-Ceramic-Capacitors-MLCC---SMD-SMT_Walsin-Tech-Corp-Walsin-Tech-Corp-0201N8R2D250CT_C2894183.html
footprint CAP-0201 (0201 (0603M) Capacitor)
pins: 1, 2

## 0201N100F500CT
designator C?  Capacitance: 10pF  (hidden comment: *)
Capacitor, Ceramic (MLCC), 10pF, ±1%, 50V, NP0, ±1%, SMD 0201; Manufacturer: Walsin Tech Corp; Manufacturer Part Number: 0201N100F500CT; Package Size: 0201; JLCPCB Basic Part: No; JLCPCB Part Number: C396694; Supplier 1: LCSC; Category: Capacitors - MLCC; Supplier Part Number 1: C396694; Tolerance: ±1%; Voltage Rating: 50V; Temperature Coefficient: NP0; RoHS: Yes; ComponentLink1Description: Datasheet; ComponentLink1URL: https://wmsc.lcsc.com/wmsc/upload/file/pdf/v2/lcsc/2304140030_Walsin-Tech-Corp-0201N100F500CT_C396694.pdf; ComponentLink2Description: JLCPCB Part URL; ComponentLink2URL: https://jlcpcb.com/partdetail/C396694; ComponentLink3Description: LCSC Part URL; ComponentLink3URL: https://lcsc.com/product-detail/Multilayer-Ceramic-Capacitors-MLCC---SMD-SMT_Walsin-Tech-Corp-Walsin-Tech-Corp-0201N100F500CT_C396694.html
footprint CAP-0201 (0201 (0603M) Capacitor)
pins: 1, 2

## 0201N100J250CT
designator C?  Capacitance: 10pF  (hidden comment: *)
Capacitor, Ceramic (MLCC), 10pF, ±5%, 25V, NP0, ±5%, SMD 0201; Manufacturer: Walsin Tech Corp; Manufacturer Part Number: 0201N100J250CT; Package Size: 0201; JLCPCB Basic Part: No; JLCPCB Part Number: C387912; Supplier 1: LCSC; Category: Capacitors - MLCC; Supplier Part Number 1: C387912; Tolerance: ±5%; Voltage Rating: 25V; Temperature Coefficient: NP0; RoHS: Yes; ComponentLink1Description: Datasheet; ComponentLink1URL: https://wmsc.lcsc.com/wmsc/upload/file/pdf/v2/lcsc/2304140030_Walsin-Tech-Corp-0201N100J250CT_C387912.pdf; ComponentLink2Description: JLCPCB Part URL; ComponentLink2URL: https://jlcpcb.com/partdetail/C387912; ComponentLink3Description: LCSC Part URL; ComponentLink3URL: https://lcsc.com/product-detail/Multilayer-Ceramic-Capacitors-MLCC---SMD-SMT_Walsin-Tech-Corp-Walsin-Tech-Corp-0201N100J250CT_C387912.html
footprint CAP-0201 (0201 (0603M) Capacitor)
pins: 1, 2

## 0201N100J500CT
designator C?  Capacitance: 10pF  (hidden comment: *)
Capacitor, Ceramic (MLCC), 10pF, ±5%, 50V, NP0, ±5%, SMD 0201; Manufacturer: Walsin Tech Corp; Manufacturer Part Number: 0201N100J500CT; Package Size: 0201; JLCPCB Basic Part: No; JLCPCB Part Number: C387913; Supplier 1: LCSC; Category: Capacitors - MLCC; Supplier Part Number 1: C387913; Tolerance: ±5%; Voltage Rating: 50V; Temperature Coefficient: NP0; RoHS: Yes; ComponentLink1Description: Datasheet; ComponentLink1URL: https://wmsc.lcsc.com/wmsc/upload/file/pdf/v2/lcsc/2304140030_Walsin-Tech-Corp-0201N100J500CT_C387913.pdf; ComponentLink2Description: JLCPCB Part URL; ComponentLink2URL: https://jlcpcb.com/partdetail/C387913; ComponentLink3Description: LCSC Part URL; ComponentLink3URL: https://lcsc.com/product-detail/Multilayer-Ceramic-Capacitors-MLCC---SMD-SMT_Walsin-Tech-Corp-Walsin-Tech-Corp-0201N100J500CT_C387913.html
footprint CAP-0201 (0201 (0603M) Capacitor)
pins: 1, 2

## 0201N101G500CT
designator C?  Capacitance: 100pF  (hidden comment: *)
Capacitor, Ceramic (MLCC), 100pF, ±2%, 50V, NP0, ±2%, SMD 0201; Manufacturer: Walsin Tech Corp; Manufacturer Part Number: 0201N101G500CT; Package Size: 0201; JLCPCB Basic Part: No; JLCPCB Part Number: C2443237; Supplier 1: LCSC; Category: Capacitors - MLCC; Supplier Part Number 1: C2443237; Tolerance: ±2%; Voltage Rating: 50V; Temperature Coefficient: NP0; RoHS: Yes; ComponentLink1Description: Datasheet; ComponentLink1URL: https://wmsc.lcsc.com/wmsc/upload/file/pdf/v2/lcsc/2309201533_Walsin-Tech-Corp-0201N101G500CT_C2443237.pdf; ComponentLink2Description: JLCPCB Part URL; ComponentLink2URL: https://jlcpcb.com/partdetail/C2443237; ComponentLink3Description: LCSC Part URL; ComponentLink3URL: https://lcsc.com/product-detail/Multilayer-Ceramic-Capacitors-MLCC---SMD-SMT_Walsin-Tech-Corp-Walsin-Tech-Corp-0201N101G500CT_C2443237.html
footprint CAP-0201 (0201 (0603M) Capacitor)
pins: 1, 2

## 0201N101J500LT
designator C?  Capacitance: 100pF  (hidden comment: *)
Capacitor, Ceramic (MLCC), 100pF, ±5%, 50V, NP0, ±5%, SMD 0201; Manufacturer: Walsin Tech Corp; Manufacturer Part Number: 0201N101J500LT; Package Size: 0201; JLCPCB Basic Part: No; JLCPCB Part Number: C364215; Supplier 1: LCSC; Category: Capacitors - MLCC; Supplier Part Number 1: C364215; Tolerance: ±5%; Voltage Rating: 50V; Temperature Coefficient: NP0; RoHS: Yes; ComponentLink1Description: Datasheet; ComponentLink1URL: https://wmsc.lcsc.com/wmsc/upload/file/pdf/v2/lcsc/2304140030_Walsin-Tech-Corp-0201N101J500LT_C364215.pdf; ComponentLink2Description: JLCPCB Part URL; ComponentLink2URL: https://jlcpcb.com/partdetail/C364215; ComponentLink3Description: LCSC Part URL; ComponentLink3URL: https://lcsc.com/product-detail/Multilayer-Ceramic-Capacitors-MLCC---SMD-SMT_Walsin-Tech-Corp-Walsin-Tech-Corp-0201N101J500LT_C364215.html
footprint CAP-0201 (0201 (0603M) Capacitor)
pins: 1, 2

## 0201N120G250CT
designator C?  Capacitance: 12pF  (hidden comment: *)
Capacitor, Ceramic (MLCC), 12pF, ±2%, 25V, NP0, ±2%, SMD 0201; Manufacturer: Walsin Tech Corp; Manufacturer Part Number: 0201N120G250CT; Package Size: 0201; JLCPCB Basic Part: No; JLCPCB Part Number: C387914; Supplier 1: LCSC; Category: Capacitors - MLCC; Supplier Part Number 1: C387914; Tolerance: ±2%; Voltage Rating: 25V; Temperature Coefficient: NP0; RoHS: Yes; ComponentLink1Description: Datasheet; ComponentLink1URL: https://wmsc.lcsc.com/wmsc/upload/file/pdf/v2/lcsc/2304140030_Walsin-Tech-Corp-0201N120G250CT_C387914.pdf; ComponentLink2Description: JLCPCB Part URL; ComponentLink2URL: https://jlcpcb.com/partdetail/C387914; ComponentLink3Description: LCSC Part URL; ComponentLink3URL: https://lcsc.com/product-detail/Multilayer-Ceramic-Capacitors-MLCC---SMD-SMT_Walsin-Tech-Corp-Walsin-Tech-Corp-0201N120G250CT_C387914.html
footprint CAP-0201 (0201 (0603M) Capacitor)
pins: 1, 2

## 0201N120J250CT
designator C?  Capacitance: 12pF  (hidden comment: *)
Capacitor, Ceramic (MLCC), 12pF, ±5%, 25V, NP0, ±5%, SMD 0201; Manufacturer: Walsin Tech Corp; Manufacturer Part Number: 0201N120J250CT; Package Size: 0201; JLCPCB Basic Part: No; JLCPCB Part Number: C424835; Supplier 1: LCSC; Category: Capacitors - MLCC; Supplier Part Number 1: C424835; Tolerance: ±5%; Voltage Rating: 25V; Temperature Coefficient: NP0; RoHS: Yes; ComponentLink1Description: Datasheet; ComponentLink1URL: https://wmsc.lcsc.com/wmsc/upload/file/pdf/v2/lcsc/2304140030_Walsin-Tech-Corp-0201N120J250CT_C424835.pdf; ComponentLink2Description: JLCPCB Part URL; ComponentLink2URL: https://jlcpcb.com/partdetail/C424835; ComponentLink3Description: LCSC Part URL; ComponentLink3URL: https://lcsc.com/product-detail/Multilayer-Ceramic-Capacitors-MLCC---SMD-SMT_Walsin-Tech-Corp-Walsin-Tech-Corp-0201N120J250CT_C424835.html
footprint CAP-0201 (0201 (0603M) Capacitor)
pins: 1, 2

## 0201N121J250CT
designator C?  Capacitance: 120pF  (hidden comment: *)
Capacitor, Ceramic (MLCC), 120pF, ±5%, 25V, NP0, ±5%, SMD 0201; Manufacturer: Walsin Tech Corp; Manufacturer Part Number: 0201N121J250CT; Package Size: 0201; JLCPCB Basic Part: No; JLCPCB Part Number: C880814; Supplier 1: LCSC; Category: Capacitors - MLCC; Supplier Part Number 1: C880814; Tolerance: ±5%; Voltage Rating: 25V; Temperature Coefficient: NP0; RoHS: Yes; ComponentLink1Description: Datasheet; ComponentLink1URL: https://wmsc.lcsc.com/wmsc/upload/file/pdf/v2/lcsc/2304140030_Walsin-Tech-Corp-0201N121J250CT_C880814.pdf; ComponentLink2Description: JLCPCB Part URL; ComponentLink2URL: https://jlcpcb.com/partdetail/C880814; ComponentLink3Description: LCSC Part URL; ComponentLink3URL: https://lcsc.com/product-detail/Multilayer-Ceramic-Capacitors-MLCC---SMD-SMT_Walsin-Tech-Corp-Walsin-Tech-Corp-0201N121J250CT_C880814.html
footprint CAP-0201 (0201 (0603M) Capacitor)
pins: 1, 2
